# Altium footprint library Arduino Nano Every PCBLib.PcbLib: 81 footprints (part 3 of 6)
Each footprint in its own frame and in the unit in brackets; x right, y up, seen from the top. Pads: shape width x height; smd on the part's side, far side on the other; paste and mask are expansions set on the pad; w line width, h text height; cw(c..) or ccw(c..) is an arc to the next point about the centre after c.
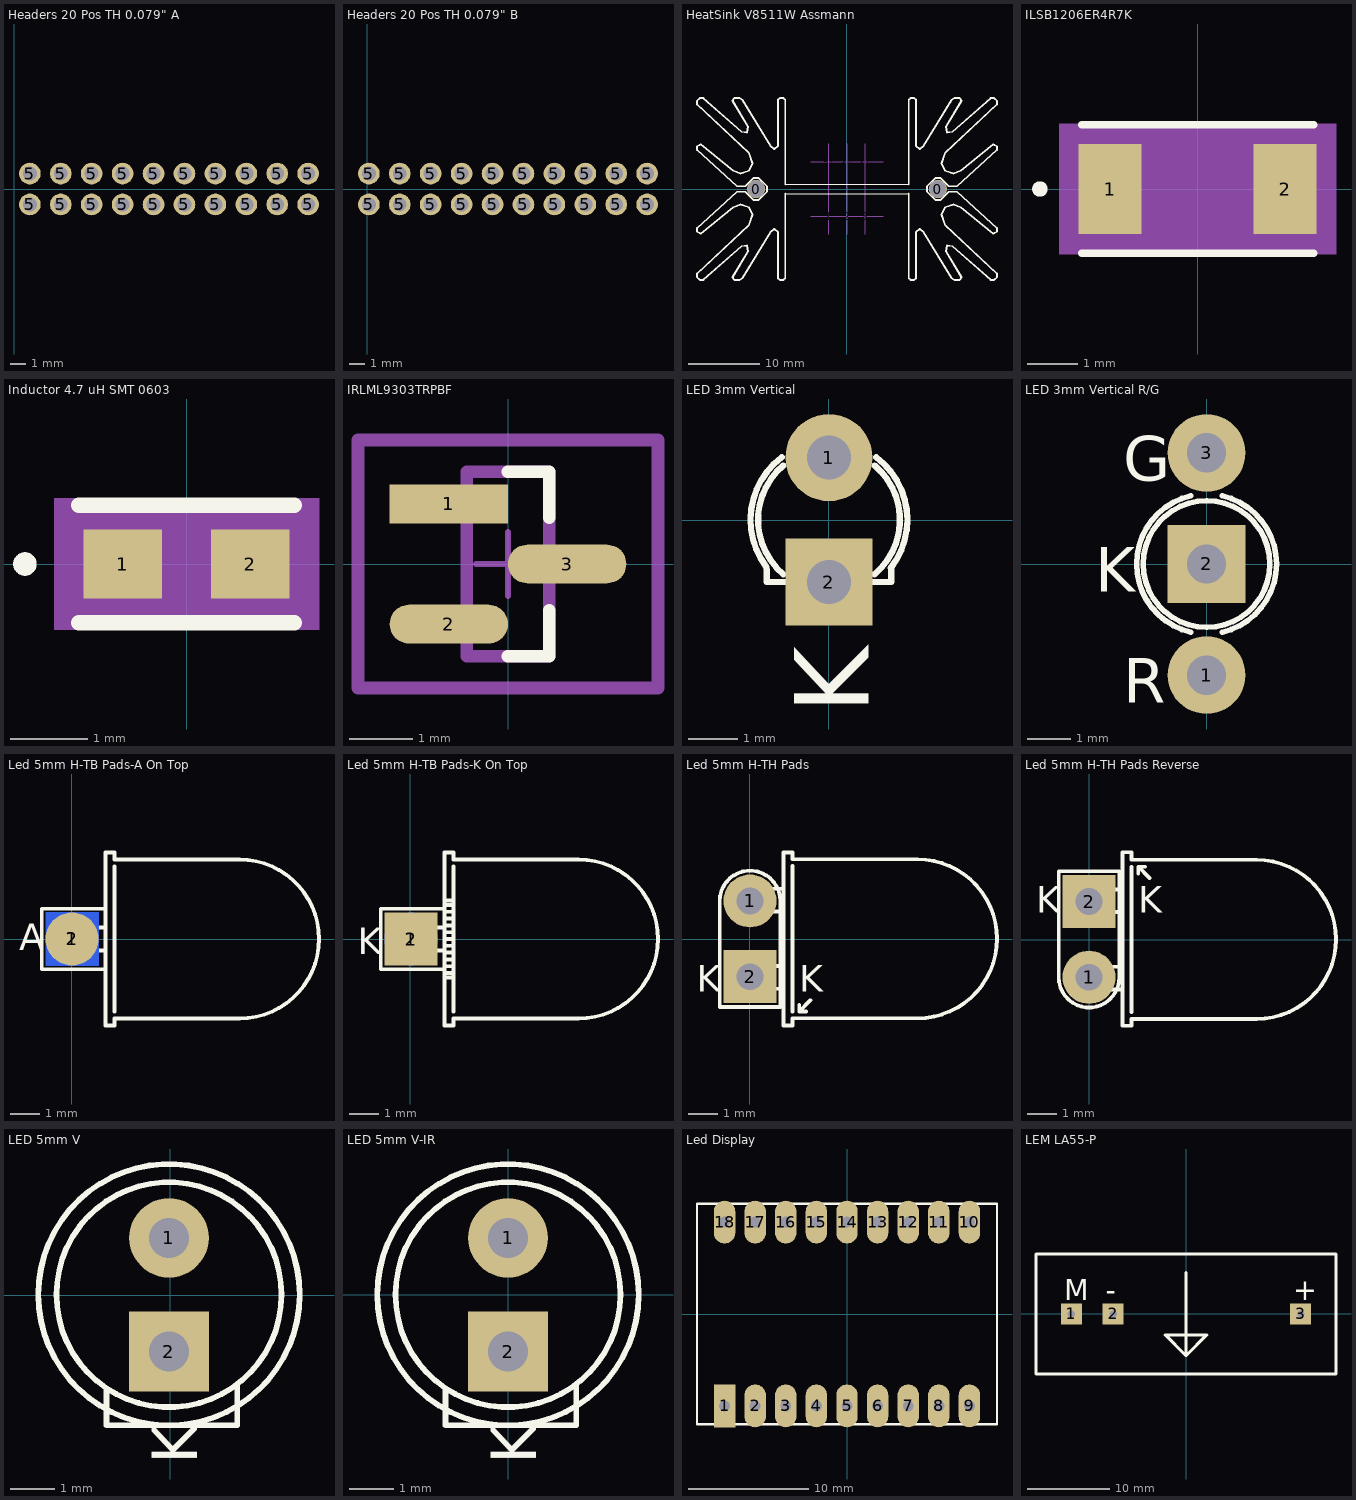
[diagram p2: the footprints below, top view; thin cyan lines are the x and y axes]

## Headers 20 Pos TH 0.079" A [mm] "Connector Header Through Hole 20 position 0.079\" (2.00mm)"
pads (20):
  round 1.4 hole 0.9: 5(1,-1) 5(1,1) 5(3,-1) 5(3,1) 5(5,-1) 5(5,1) 5(7,-1) 5(7,1) 5(9,-1) 5(9,1) 5(11,-1) 5(11,1) 5(13,-1) 5(13,1) 5(15,-1) 5(15,1) 5(17,-1) 5(17,1) 5(19,-1) 5(19,1)
3D body "BF050-20-A-B-0300-0600-N-G.stp": height 5, standoff -6, extent 0,-2 20,2

## Headers 20 Pos TH 0.079" B [mm] "Connector Header Through Hole 20 position 0.079\" (2.00mm)"
pads (20):
  round 1.4 hole 0.9: 5(0.1,-1) 5(0.1,1) 5(2.1,-1) 5(2.1,1) 5(4.1,-1) 5(4.1,1) 5(6.1,-1) 5(6.1,1) 5(8.1,-1) 5(8.1,1) 5(10.1,-1) 5(10.1,1) 5(12.1,-1) 5(12.1,1) 5(14.1,-1) 5(14.1,1) 5(16.1,-1) 5(16.1,1) 5(18.1,-1) 5(18.1,1)

## HeatSink V8511W Assmann [mil] "HeatSink V8511W Assmann"
pads (8):
  round 100 hole 91: 0(-498.76,0) 0(501.24,0)
  oval 80x125 on Top Solder: 1(-98.76,-150) 1*(101.24,150) 2(1.24,-150) 2*(1.24,150) 3(101.24,-150) 3*(-98.76,150)
Top Overlay:
  lines w5: -338.76,-25 341.24,-25 ; -338.76,25 341.24,25
  lines w10: -338.76,-25 -338.76,-490 -348.76,-500 -368.76,-500 -378.76,-490 -378.76,-235 -398.76,-220 -418.76,-235 -573.76,-490 -588.76,-500 -618.76,-500 -628.76,-485 -543.76,-345 -548.76,-310 -578.76,-315 -788.76,-500 -808.76,-500 -823.76,-485 -823.76,-465 -538.76,-200 -518.76,-140 -538.76,-100 -583.76,-85 -623.76,-100 -803.76,-245 -823.76,-235 -823.76,-215 -603.76,-15 -558.76,-15 -513.76,-60 -483.76,-60 -438.76,-15 -438.76,15 -483.76,60 -513.76,60 -558.76,15 -603.76,15 -823.76,215 -823.76,235 -803.76,245 -623.76,100 -583.76,85 -538.76,100 -518.76,140 -538.76,200 -823.76,465 -823.76,485 -808.76,500 -788.76,500 -578.76,315 -548.76,310 -543.76,345 -628.76,485 -618.76,500 -588.76,500 -573.76,490 -418.76,235 -398.76,220 -378.76,235 -378.76,490 -368.76,500 -348.76,500 -338.76,490 -338.76,25 ; 341.24,-25 341.24,-490 351.24,-500 371.24,-500 381.24,-490 381.24,-235 401.24,-220 421.24,-235 576.24,-490 591.24,-500 621.24,-500 631.24,-485 546.24,-345 551.24,-310 581.24,-315 791.24,-500 811.24,-500 826.24,-485 826.24,-465 541.24,-200 521.24,-140 541.24,-100 586.24,-85 626.24,-100 806.24,-245 826.24,-235 826.24,-215 606.24,-15 561.24,-15 516.24,-60 486.24,-60 441.24,-15 441.24,15 486.24,60 516.24,60 561.24,15 606.24,15 826.24,215 826.24,235 806.24,245 626.24,100 586.24,85 541.24,100 521.24,140 541.24,200 826.24,465 826.24,485 811.24,500 791.24,500 581.24,315 551.24,310 546.24,345 631.24,485 621.24,500 591.24,500 576.24,490 421.24,235 401.24,220 381.24,235 381.24,490 371.24,500 351.24,500 341.24,490 341.24,25
Top 3D Body:
  lines w2: -198.76,-150 201.24,-150 ; -198.76,150 201.24,150 ; -98.76,-250 -98.76,250 ; 1.24,-250 1.24,250 ; 101.24,-250 101.24,250
3D body: height 100, standoff -100, extent 456.35,-44.97 546.25,44.98
3D body: height 100, standoff -100, extent -543.65,-44.97 -453.75,44.98
3D body: height 1000, standoff 0, extent -823.76,-500 826.24,500

## ILSB1206ER4R7K [mil] "4.7 µH Shielded Multilayer Inductor 50 mA 900mOhm Max 1206 (3216 Metric)"
pads (2):
  rect 49x70 smd paste+0 mask+0: 1(-68,0) 2(68,0)
Top Overlay:
  circle w6: c-122.5,0 r3
  lines w6: -90,-50 90,-50 ; -90,50 90,50
Mechanical 5:
  region: 107.5,-50.5 -107.5,-50.5 -107.5,50.5 107.5,50.5
Mechanical 13:
  circle w0: c-64,0 r3
  lines w1: -67,-35.5 67,-35.5 67,35.5 -67,35.5 -67,-35.5
Mechanical 15:
  region: -77,-45 -102.5,-45 -102.5,45 -77,45 -77,45.5 77,45.5 77,45 102.5,45 102.5,-45 77,-45 77,-45.5 -77,-45.5
  lines w6: -102.5,-45 -102.5,45 -77,45 -77,45.5 77,45.5 77,45 102.5,45 102.5,-45 77,-45 77,-45.5 -77,-45.5 -77,-45 -102.5,-45
3D body "IND_VISHAY_ILSB1206_VIS.step": height 55, standoff 0, extent -67.01,-35.59 67.01,35.59

## Inductor 4.7 uH SMT 0603 [mil] "4.7 µH Shielded Multilayer Inductor 15 mA 2.1Ohm Max 0603 (1608 Metric)"
pads (2):
  rect 40x35 smd paste+0 mask+0: 1(-32.5,0) 2(32.5,0)
Top Overlay:
  circle w6: c-82.5,0 r3
  lines w7.87: -55,-30 55,-30 ; -55,30 55,30
Mechanical 5:
  region: 67.5,-33.5 -67.5,-33.5 -67.5,33.5 67.5,33.5
Mechanical 13:
  circle w0: c-31.5,0 r3
  lines w1: -34.5,-18.5 -34.5,18.5 34.5,18.5 34.5,-18.5 -34.5,-18.5
Mechanical 15:
  region: -44.5,-27.5 -62.5,-27.5 -62.5,27.5 -44.5,27.5 -44.5,28.5 44.5,28.5 44.5,27.5 62.5,27.5 62.5,-27.5 44.5,-27.5 44.5,-28.5 -44.5,-28.5
  lines w6: -62.5,-27.5 -44.5,-27.5 -44.5,-28.5 44.5,-28.5 44.5,-27.5 62.5,-27.5 62.5,27.5 44.5,27.5 44.5,28.5 -44.5,28.5 -44.5,27.5 -62.5,27.5 -62.5,-27.5
3D body "IND_VISHAY_ILSB0603_VIS.step": height 39.02, standoff 0, extent -34.49,-18.58 34.49,18.58

## IRLML9303TRPBF [mm] "P-Channel 30 V 2.3A (Ta) 1.25W (Ta) Surface Mount Micro3™/SOT-23"
pads (3):
  rect 1.874x0.612 smd paste+0 mask+0: 1(-0.935,0.95)
  rrect100% 1.874x0.612 smd paste+0 mask+0: 2(-0.935,-0.95) 3(0.935,0)
Top Overlay:
  lines w0.2: 0,-1.46 0.65,-1.46 0.65,-0.73 ; 0,1.46 0.65,1.46 0.65,0.73
Top Assembly:
  lines w0.2: -2.372,-1.96 -2.372,1.96 2.372,1.96 2.372,-1.96 -2.372,-1.96
Top Courtyard:
  lines w0.2: -2.372,-1.96 -2.372,1.96 2.372,1.96 2.372,-1.96 -2.372,-1.96
Board:
  lines w0.2: -0.65,-1.46 -0.65,1.46 0.65,1.46 0.65,-1.46 -0.65,-1.46
Top Component Center:
  lines w0.1: -0.5,0 0.5,0 ; 0,-0.5 0,0.5
3D body "Trans_Infineon_IRLML2030TRPBF_eec.STEP": height 0.25, standoff 0, extent -2.372,-1.96 2.372,1.96

## LED 3mm Vertical [mil] "LED 3mm Vertical"
pads (2):
  round 70 hole 35.4: 1(0,50.28)
  rect 70x70 hole 35.4: 2(0,-49.72)
Top Overlay:
  lines w5: -50.32,-37.63 cw(c0,0.28) -37.92,50.6 ; -50,-39.72 -50,-49.72 50,-49.72 50,-39.72 ; -36.64,-43.38 cw(c0,0.28) -36.64,43.95 ; 36.64,-43.38 ccw(c0,0.28) 36.64,43.95 ; 37.91,50.6 cw(c0,0.28) 49.64,-38.51
  text "K" at 32,-155.72 h60
3D body: height 20, standoff 10, extent -68.45,-68.57 69,69.16
3D body: height 20, standoff 10, extent -50,-74.72 50,-49.72
3D body: height 185, standoff 10, extent -61.5,-61.59 62.01,62.17
3D body: height 10, standoff -30, extent -14.88,35.34 15,65.28
3D body: height 10, standoff -30, extent -14.88,-64.68 15,-34.74
3D body: height 242, standoff 118, extent -61.94,-61.69 61.94,62.28

## LED 3mm Vertical R/G [mil] "LED 3mm Vertical R/G"
pads (3):
  round 70 hole 35.4: 1(-0.03,-99.69) 3(-0.03,100.31)
  rect 70x70 hole 35.4: 2(-0.03,0.31)
Top Overlay:
  circle w5: c-0.03,0.31 r57
  lines w5: -14.15,61.7 ccw(c-0.03,0.31) -14.09,-61.1 ; 14.09,61.7 cw(c-0.03,0.31) 14.15,-61.08
  text "G" at -75.03,75.31 h40
  text "R" at -75.03,-124.69 h40
  text "K" at -100.03,-24.69 h40
3D body: height 50, standoff -30, extent -14.91,85.34 14.98,115.28
3D body: height 60, standoff 50, extent -68.47,-68.55 68.98,69.18
3D body: height 70, standoff 50, extent -50.03,-74.69 49.97,-49.69
3D body: height 195, standoff 50, extent -61.53,-61.56 61.98,62.2
3D body: height 50, standoff -30, extent -14.9,-14.65 14.98,15.29
3D body: height 50, standoff -30, extent -14.91,-114.66 14.98,-84.72
3D body: height 242, standoff 118, extent -61.37,-61.42 61.98,62.05

## Led 5mm H-TB Pads-A On Top [mil] "Led 5mm H-TB Pads-A On Top"
pads (2):
  rect 70x70 smd far side: 1(0.43,0.3)
  rrect100% 70x70 smd: 2(0.43,0.3)
Top Overlay:
  lines w5: 43.43,-39.7 -39.58,-39.7 -39.58,40.3 43.43,40.3 ; 44.43,-14.7 -14.58,-14.7 -14.58,15.3 44.43,15.3 ; 56.43,-95.7 56.43,96.3 ; 44.43,-113.7 44.43,114.3 56.43,114.3 56.43,105.3 221.43,105.3 cw(c221.43,0.3) 221.43,-104.7 56.43,-104.7 56.43,-113.7 44.43,-113.7
  text "A" at -69.58,-14.7 h35
3D body: height 40, standoff 0, extent -14.45,-14.66 15.43,15.28
3D body: height 114.09, standoff -115, extent 45.43,-114.25 55.43,115.3
3D body: height 104.17, standoff -105, extent 55.43,-104.27 230.42,105.32
3D body: height 40, standoff 0, extent -14.45,-14.66 15.43,15.28
3D body: height 105, standoff -105, extent 120.43,-104.25 329.41,104.85
3D body: height -100, standoff -125, extent 45.43,-49.7 55.43,50.3
3D body: height 39.88, standoff 10, extent -14.45,-14.66 45.55,15.28
3D body: height -27.12, standoff -57, extent -14.57,-14.7 45.43,15.24

## Led 5mm H-TB Pads-K On Top [mil] "Led 5mm H-TB Pads-K On Top"
pads (2):
  rect 70x70 smd: 1(0.72,0)
  rrect100% 70x70 smd far side: 2(0.72,0)
Top Overlay:
  lines w5: 43.72,-40 -39.28,-40 -39.28,40 43.72,40 ; 44.72,-51 56.72,-51 ; 44.72,-45 56.72,-45 ; 44.72,-36 56.72,-36 ; 44.72,-27 56.72,-27 ; 44.72,-18 56.72,-18 ; 44.72,-15 -14.28,-15 -14.28,15 44.72,15 ; 44.72,-9 56.72,-9 ; 44.72,0 56.72,0 ; 44.72,9 56.72,9 ; 44.72,18 56.72,18 ; 44.72,27 56.72,27 ; 44.72,36 56.72,36 ; 44.72,45 56.72,45 ; 44.72,51 56.72,51 ; 56.72,-96 56.72,96 ; 44.72,-114 44.72,114 56.72,114 56.72,105 221.72,105 cw(c221.72,0) 221.72,-105 56.72,-105 56.72,-114 44.72,-114
  text "K" at -69.28,-20 h35
3D body: height -27.12, standoff -57, extent -14.28,-14.97 45.72,14.97
3D body: height 39.88, standoff 10, extent -14.28,-14.94 45.72,15
3D body: height 125, standoff 100, extent 45.72,-50 55.72,50
3D body: height 105, standoff -105, extent 120.72,-104.55 329.71,104.55
3D body: height 40, standoff 0, extent -14.15,-14.96 15.73,14.98
3D body: height 104.17, standoff -105, extent 55.72,-104.57 230.72,105.02
3D body: height 114.09, standoff -115, extent 45.72,-114.55 55.72,115
3D body: height 40, standoff 0, extent -14.15,-14.96 15.73,14.97

## Led 5mm H-TH Pads [mil] "Led 5mm H-TH Pads"
pads (2):
  round 70 hole 35.4: 1(0.12,50.28)
  rect 70x70 hole 35.4: 2(0.12,-49.72)
Top Overlay:
  lines w5: -39.88,50 cw(c0.12,50.28) 40.12,49.96 ; -39.88,50.31 -39.88,-89.72 40.12,-89.72 40.12,50.28 ; 40.12,-65.72 -14.88,-65.72 -14.88,-35.72 40.12,-35.72 ; 40.12,36.28 -14.88,36.28 -14.88,66.28 43.12,66.28 ; 56.12,-95.72 56.12,96.28 ; 74.12,-95.72 65.12,-95.72 ; 65.12,-95.72 65.12,-86.72 65.12,-95.72 ; 65.12,-95.72 80.12,-80.72 65.12,-95.72 ; 44.12,-114.27 56.12,-114.27 56.12,-104.72 221.12,-104.72 ccw(c221.12,0.28) 221.12,105.28 56.12,105.28 56.12,114.28 44.12,114.28 44.12,-114.27
  text "K" at -69.88,-69.72 h35
  text "K" at 65.12,-69.72 h35
3D body: height 30, standoff -20, extent -14.76,35.31 15.12,65.25
3D body: height 129.09, standoff -100, extent 45.12,-114.27 55.12,115.28
3D body: height 119.17, standoff -90, extent 55.12,-104.29 230.12,105.29
3D body: height 30, standoff -20, extent -14.76,-64.69 15.12,-34.75
3D body: height 120, standoff -90, extent 120.12,-104.28 329.11,104.83
3D body: height 60, standoff -30, extent 45.12,-114.27 55.12,-14.27
3D body: height 29.88, standoff 0, extent -14.88,35.27 45.12,65.21
3D body: height 29.88, standoff 0, extent -14.88,-64.69 45.12,-34.76

## Led 5mm H-TH Pads Reverse [mil] "Led 5mm H-TH Pads Reverse"
pads (2):
  round 70 hole 35.4: 1(-0.18,-49.59)
  rect 70x70 hole 35.4: 2(-0.18,50.41)
Top Overlay:
  lines w5: -40.18,-49.59 -40.18,90.41 39.82,90.41 39.82,-49.63 ; -40.18,-49.28 ccw(c-0.18,-49.59) 39.82,-49.32 ; 43.82,-65.59 -15.18,-65.59 -15.18,-35.59 43.82,-35.59 ; 43.82,36.41 -15.18,36.41 -15.18,66.41 43.82,66.41 ; 55.82,-95.59 55.82,96.41 ; 73.82,96.41 64.82,96.41 ; 79.82,81.41 64.82,96.41 ; 64.82,96.41 64.82,87.41 64.82,96.41 ; 43.82,-113.59 55.82,-113.59 55.82,-104.59 220.82,-104.59 ccw(c220.82,0.41) 220.82,105.41 55.82,105.41 55.82,115.41 43.82,115.41 43.82,-113.59
  text "K" at 64.82,35.41 h35
  text "K" at -70.18,35.41 h35
3D body: height 29.88, standoff 0, extent -15.18,-64.59 44.82,-34.65
3D body: height 29.88, standoff 0, extent -15.18,35.44 44.82,65.38
3D body: height 60, standoff -30, extent 44.82,15.41 54.82,115.41
3D body: height 120, standoff -90, extent 119.82,-104.15 328.81,104.96
3D body: height 30, standoff -20, extent -15.06,-64.56 14.82,-34.62
3D body: height 119.17, standoff -90, extent 54.82,-104.16 229.82,105.42
3D body: height 129.09, standoff -100, extent 44.82,-114.14 54.82,115.41
3D body: height 30, standoff -20, extent -15.06,35.44 14.82,65.38

## LED 5mm V [mil] "LED 5mm V"
pads (2):
  round 70 hole 35.4: 1(-0.9,50.57)
  rect 70x70 hole 35.4: 2(-0.9,-49.43)
Top Overlay:
  circle w5: c-0.9,0.57 r115
  circle w5: c-0.9,0.57 r99
  lines w5: -55.9,-82.43 -55.9,-114.43 59.1,-114.43 59.1,-78.43
  text "K" at 24.1,-148.43 h40
3D body: height 285, standoff 75, extent -104.88,-103.97 104.11,105.13
3D body: height 10, standoff -30, extent -15.78,-64.39 14.11,-34.45
3D body: height 185, standoff 10, extent -105.07,-104.21 104.11,105.37
3D body: height 20, standoff 10, extent -55.9,-114.43 59.1,-79.43
3D body: height 20, standoff 10, extent -114.98,-114.2 114.11,115.35
3D body: height 10, standoff -30, extent -15.78,35.61 14.11,65.55

## LED 5mm V-IR [mil] "LED 5mm V-IR"
pads (2):
  round 70 hole 35.4: 1(-0.3,49.97)
  rect 70x70 hole 35.4: 2(-0.3,-50.03)
Top Overlay:
  circle w5: c-0.3,-0.03 r99
  circle w5: c-0.3,-0.03 r115
  lines w5: -55.3,-84.03 -55.3,-115.03 59.7,-115.03 59.7,-79.03
  text "K" at 24.7,-149.03 h40
3D body: height 20, standoff 10, extent -114.38,-114.79 114.71,114.76
3D body: height 20, standoff 10, extent -55.3,-115.03 59.7,-80.03
3D body: height 185, standoff 10, extent -104.47,-104.81 104.7,104.77
3D body: height 10, standoff -30, extent -15.18,35.01 14.7,64.95
3D body: height 10, standoff -30, extent -15.18,-64.99 14.7,-35.05
3D body: height 285, standoff 75, extent -104.2,-104.57 104.7,104.53

## Led Display [mil] "Led Display"
pads (18):
  rect 70x140 hole 35.4: 1(-400,-300)
  oval 70x140 hole 35.4: 2(-300,-300) 3(-200,-300) 4(-100,-300) 5(0,-300) 6(100,-300) 7(200,-300) 8(300,-300) 9(400,-300) 10(400,300) 11(300,300) 12(200,300) 13(100,300) 14(0,300) 15(-100,300) 16(-200,300) 17(-300,300) 18(-400,300)
Top Overlay:
  lines w7: -490,-360 -490,360 490,360 490,-360 -490,-360
3D body: height 45, standoff -25, extent 384.04,284.01 416,316
3D body: height 45, standoff -25, extent 384.04,-315.99 416.01,-284
3D body: height 45, standoff -25, extent -415.96,284.01 -384,315.99
3D body: height 45, standoff -25, extent -315.96,284.01 -284,316
3D body: height 45, standoff -25, extent -215.96,284.01 -184,316
3D body: height 45, standoff -25, extent -115.96,284.01 -84,316
3D body: height 45, standoff -25, extent -15.96,284.01 16,316
3D body: height 45, standoff -25, extent 84.04,284.02 116,316
3D body: height 45, standoff -25, extent 184.04,284.02 216,316
3D body: height 45, standoff -25, extent 284.04,284.02 316,316
3D body: height 45, standoff -25, extent 284.04,-315.98 316,-284
3D body: height 45, standoff -25, extent 184.04,-315.98 216,-284
3D body: height 45, standoff -25, extent 84.04,-315.98 116,-284
3D body: height 45, standoff -25, extent -15.96,-315.98 16,-284
3D body: height 45, standoff -25, extent -115.96,-315.98 -84,-284
3D body: height 45, standoff -25, extent -215.96,-315.98 -183.99,-284
3D body: height 45, standoff -25, extent -315.96,-315.98 -283.99,-284
3D body: height 45, standoff -25, extent -415.96,-315.99 -384,-284
3D body: height 318, standoff 315, extent 400.04,-259.98 460.01,-200
3D body: height 318, standoff 315, extent -79.96,-259.99 -20,-200.01
3D body: height 318, standoff 315, extent 139.5,-27 344.5,23
3D body: height 318, standoff 315, extent 55.82,-260.43 136.65,-3
3D body: height 318, standoff 315, extent 169,209 369,259
3D body: height 318, standoff 315, extent 114,-261 314,-211
3D body: height 318, standoff 315, extent 79.99,1 169.31,258.08
3D body: height 318, standoff 315, extent 313.69,-262.08 403.01,-5
3D body: height 318, standoff 315, extent 348.44,2.29 429.27,259.72
3D body: height 318, standoff 315, extent -130.56,3.29 -49.73,260.72
3D body: height 318, standoff 315, extent -165.31,-261.08 -75.99,-4
3D body: height 318, standoff 315, extent -399.01,2 -309.69,259.08
3D body: height 318, standoff 315, extent -365,-260 -165,-210
3D body: height 318, standoff 315, extent -310,210 -110,260
3D body: height 318, standoff 315, extent -340,-25 -135,25
3D body: height 51, standoff 45, extent -485,-355 485,355
3D body: height 315, standoff 50, extent -490,-360 490,360
3D body: height 50, standoff 0, extent 430,300 490,360
3D body: height 50, standoff 0, extent 430,-360 490,-300
3D body: height 50, standoff 0, extent -490,-360 -430,-300
3D body: height 50, standoff 0, extent -490,300 -430,360
3D body: height 317, standoff 315, extent -490,-360 490,360
3D body: height 318, standoff 315, extent -423.18,-259.43 -342.35,-2
3D body: height 45, standoff 42, extent 75,70 130,144.98
3D body: height 45, standoff 42, extent 15,70 65,140
3D body: height 45, standoff 42, extent -45,70 5,140
3D body: height 45, standoff 42, extent -85,70 -55,140
3D body: height 45, standoff 42, extent -155,70 -105,140

## LEM LA55-P [mm] "LEM LA55-P"
pads (3):
  rect 2.54x2.54 hole 0.899: 1(-13.998,-0.028) 2(-8.918,-0.028) 3(13.942,-0.028)
Top Overlay:
  lines w0.381: -0.028,5.052 -0.028,-5.108 ; -0.028,-5.108 2.512,-2.568 -2.568,-2.568 -0.028,-5.108 ; -18.316,-7.343 18.26,-7.343 18.26,7.288 -18.316,7.288 -18.316,-7.343
  text "M" at -14.887,1.623 h2.54
  text "-" at -9.807,1.623 h2.54
  text "+" at 13.053,1.623 h2.54
3D body: height 25.63, standoff 0.03, extent -18.315,-7.063 18.261,7.288